# Altium footprint library MODULE_MISC.PcbLib: 28 footprints (part 2 of 2)
Each footprint in its own frame and in the unit in brackets; x right, y up, seen from the top. Pads: shape width x height; smd on the part's side, far side on the other; paste and mask are expansions set on the pad; w line width, h text height; cw(c..) or ccw(c..) is an arc to the next point about the centre after c.
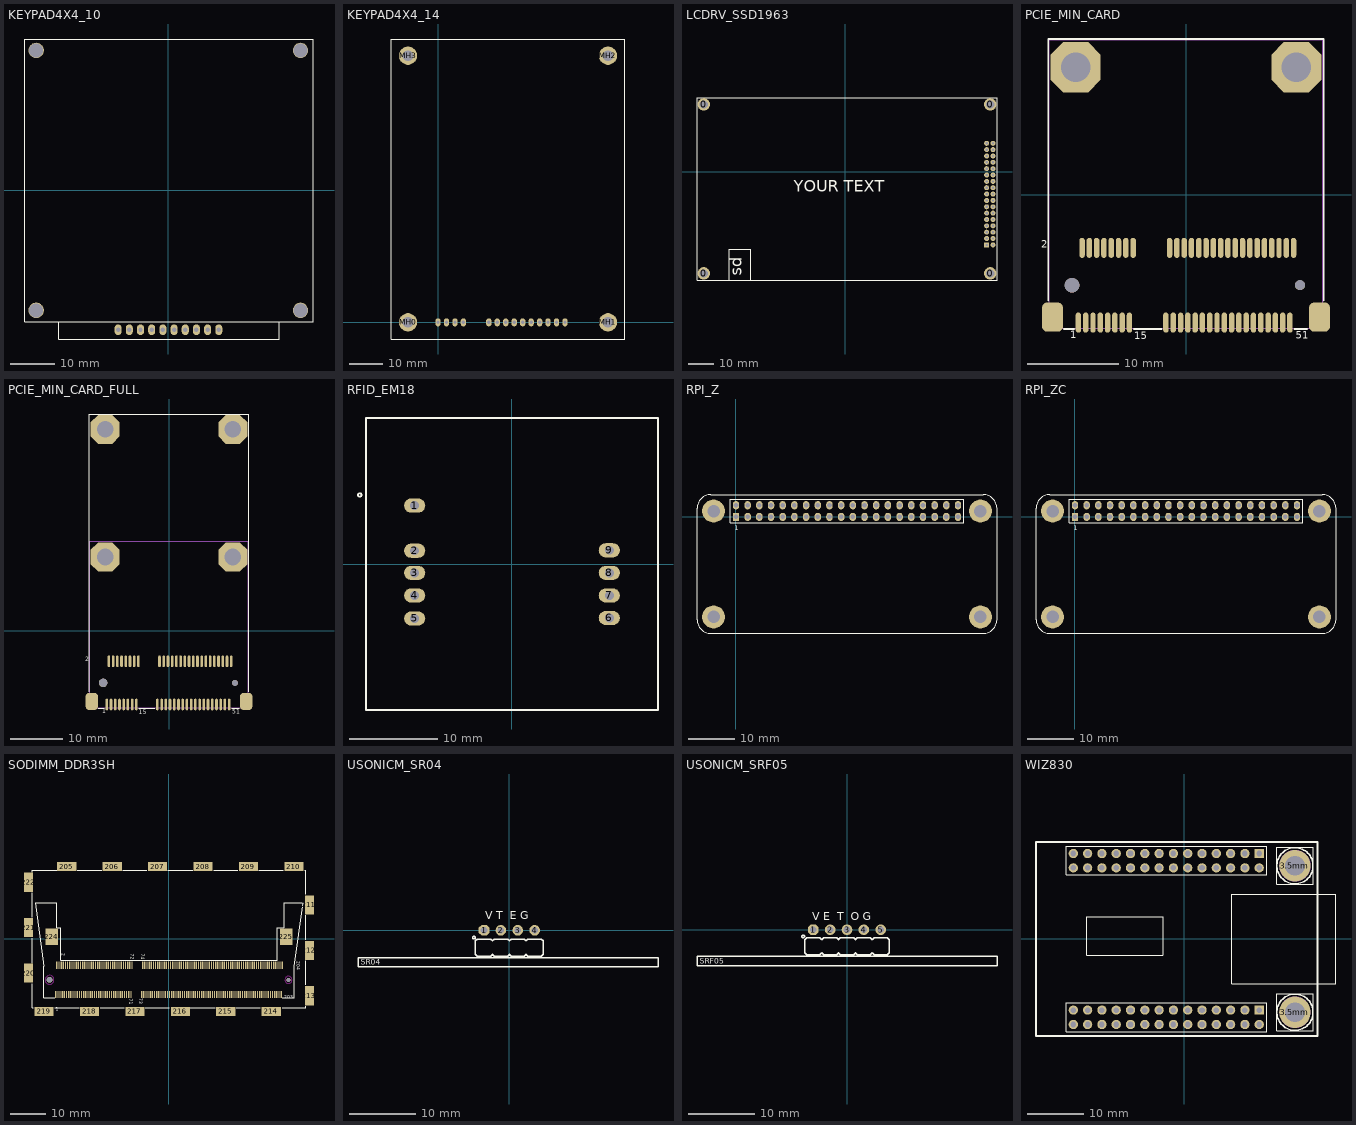
[diagram p1: the footprints below, top view; thin cyan lines are the x and y axes]

## KEYPAD4X4_10 [mm] "Matrix Keyboard 4x4"
pads (14):
  oval 1.6x2.4 hole 1: C1(-8.86,-31.7) C2(-6.32,-31.7) C3(-3.78,-31.7) C4(-1.24,-31.7) R1(1.3,-31.7) R2(3.84,-31.7) R3(6.38,-31.7) R4(8.92,-31.7) ""(-11.4,-31.7) ""(11.46,-31.7)
  round 3.5 / inner round 3.5 / far side round 5.5 hole 3.2: ""(-30,-27.3) ""(-30,31.7) ""(30,-27.3) ""(30,31.7)
Top Overlay:
  lines w0.2: -24.9,-29.9 -24.9,-33.8 25.2,-33.8 25.2,-29.9 ; -32.6,-29.9 -32.6,34.3 32.9,34.3 32.9,-29.9 -32.6,-29.9
3D body "User Library-Keypad 4x4.step": height 12.08, standoff 2.68, extent -32.539,-33.6 32.739,34.218

## KEYPAD4X4_14 [mm] "Matrix Keyboard 4x4"
pads (18):
  oval 1.6x2.4 hole 1: C1(17.78,0) C2(20.32,0) C3(22.86,0) C4(25.4,0) COM(38.1,0) L1(27.94,0) L2(30.48,0) L3(33.02,0) L4(35.56,0) R1(0,0) R2(2.54,0) R3(5.08,0) R4(7.62,0) V(15.24,0)
  round 5.5 hole 3.2: MH0(-9,0) MH1(51,0) MH2(51,80) MH3(-9,80)
Top Overlay:
  lines w0.2: -14,-5 -14,85 56,85 56,-5 -14,-5
3D body "header04-15mm.STEP": height 18.03, standoff -2.54, extent -1.27,-1.27 8.89,1.27
3D body "header10-15mm.STEP": height 18.03, standoff -2.54, extent 13.97,-1.27 39.37,1.27
3D body "Spacer.STEP": height 15, standoff -5, extent -11.858,77.525 -6.142,82.475
3D body "Spacer.STEP": height 15, standoff -5, extent -11.858,-2.475 -6.142,2.475
3D body "Spacer.STEP": height 15, standoff -5, extent 48.142,-2.475 53.858,2.475
3D body "Spacer.STEP": height 15, standoff -5, extent 48.142,77.525 53.858,82.475
3D body "Keyboard.STEP": height 22.22, standoff 15, extent -14,-5 56,85

## LCDRV_SSD1963 [mm] "SSD1963 Module.3 Or 5 Inch"
pads (38):
  round 5 hole 3.2: 0(-56.6,-40.7) 0(-56.6,26.9) 0(58,-40.7) 0(58,26.9)
  rect 2x2 hole 0.9: 1(56.56,-29.3)
  round 2 hole 0.9: 2(59.1,-29.3) 3(56.56,-26.76) 4(59.1,-26.76) 5(56.56,-24.22) 6(59.1,-24.22) 7(56.56,-21.68) 8(59.1,-21.68) 9(56.56,-19.14) 10(59.1,-19.14) 11(56.56,-16.6) 12(59.1,-16.6) 13(56.56,-14.06) 14(59.1,-14.06) 15(56.56,-11.52) 16(59.1,-11.52) 17(56.56,-8.98) 18(59.1,-8.98) 19(56.56,-6.44) 20(59.1,-6.44) 21(56.56,-3.9) 22(59.1,-3.9) 23(56.56,-1.36) 24(59.1,-1.36) 25(56.56,1.18) 26(59.1,1.18) 27(56.56,3.72) 28(59.1,3.72) 29(56.56,6.26) 30(59.1,6.26) 31(56.56,8.8) 32(59.1,8.8) 33(56.56,11.34) 34(59.1,11.34)
Top Overlay:
  lines w0.2: -38,-31 -37.9,-31 ; -37.9,-31 -37.9,-43.5 -46.4,-43.5 -46.4,-31 -37.9,-31
  lines w0.5: -59.3,-43.4 -59.3,29.6 60.7,29.6 60.7,-43.4 -59.3,-43.4
  text "YOUR TEXT" at -20.7,-9.6 h8
  text "sd" at -39.9,-41.7 h8
3D body "Header 6.STEP": height 9.54, standoff -2, extent 57.86,-30.59 60.35,-15.35
3D body "Header 10.STEP": height 9.54, standoff -2, extent 57.86,-15.35 60.35,10.05
3D body "Header 6.STEP": height 9.54, standoff -2, extent 55.32,-30.59 57.81,-15.35
3D body "Header 10.STEP": height 9.54, standoff -2, extent 55.32,-15.35 57.81,10.05
3D body "Header 2.STEP": height 9.54, standoff -2, extent 55.29,10.14 60.37,12.63
3D body "Header 6.STEP": height 9.54, standoff -2, extent -56.4,-30.69 -53.91,-15.45
3D body "Header 10.STEP": height 9.54, standoff -2, extent -56.4,-15.45 -53.91,9.95
3D body "Header 6.STEP": height 9.54, standoff -2, extent -58.94,-30.69 -56.45,-15.45
3D body "Header 10.STEP": height 9.54, standoff -2, extent -58.94,-15.45 -56.45,9.95
3D body "Header 2.STEP": height 9.54, standoff -2, extent -58.97,10.04 -53.89,12.53

## PCIE_MIN_CARD [mm] "PCIE_MINI_CARD molex 679100002"
height 4
pads (58):
  oval 0.6x2.2 smd: 1(-11.8,-14) 2(-11.4,-5.8) 3(-11,-14) 4(-10.6,-5.8) 5(-10.2,-14) 6(-9.8,-5.8) 7(-9.4,-14) 8(-9,-5.8) 9(-8.6,-14) 10(-8.2,-5.8) 11(-7.8,-14) 12(-7.4,-5.8) 13(-7,-14) 14(-6.6,-5.8) 15(-6.2,-14) 16(-5.8,-5.8) 17(-2.2,-14) 18(-1.8,-5.8) 19(-1.4,-14) 20(-1,-5.8) 21(-0.6,-14) 22(-0.2,-5.8) 23(0.2,-14) 24(0.6,-5.8) 25(1,-14) 26(1.4,-5.8) 27(1.8,-14) 28(2.2,-5.8) 29(2.6,-14) 30(3,-5.8) 31(3.4,-14) 32(3.8,-5.8) 33(4.2,-14) 34(4.6,-5.8) 35(5,-14) 36(5.4,-5.8) 37(5.8,-14) 38(6.2,-5.8) 39(6.6,-14) 40(7,-5.8) 41(7.4,-14) 42(7.8,-5.8) 43(8.2,-14) 44(8.6,-5.8) 45(9,-14) 46(9.4,-5.8) 47(9.8,-14) 48(10.2,-5.8) 49(10.6,-14) 50(11,-5.8) 51(11.4,-14) 52(11.8,-5.8)
  rrect50% 2.311x3.2 smd: " "(-14.65,-13.4) " "(14.65,-13.4)
  round 1.6 hole 1.6 unplated: " "(-12.5,-9.9)
  oct 5.5x5.5 hole 3.2: " "(-12.1,14) " "(12.1,14)
  round 1.1 hole 1.1 unplated: " "(12.5,-9.9)
Top Overlay:
  lines w0.2: -15.1,-11.6 -15.1,17.1 15.1,17.1 15.1,-11.6 ; -13.4,-14.7 -12.3,-14.7 ; -5.7,-14.7 -2.7,-14.7 ; 11.9,-14.7 13.3,-14.7
  text "1" at -12.7,-15.7 h0.8
  text "2" at -15.9,-5.8 h0.8
  text "51" at 12.011,-15.763 h0.8
  text "15" at -5.7,-15.8 h0.8
Top Solder:
  pour cut-out: 11.756,-15.054 11.756,-12.946 -2.556,-12.946 -2.556,-15.054
  pour cut-out: -5.844,-15.054 -5.844,-12.946 -12.156,-12.946 -12.156,-15.054
  pour cut-out: -5.444,-6.854 -5.444,-4.746 -11.756,-4.746 -11.756,-6.854
  pour cut-out: 12.156,-6.854 12.156,-4.746 -2.156,-4.746 -2.156,-6.854
Mechanical 13:
  lines w0.1: -15,-14.6 15,-14.6 15,17 -15,17 -15,-14.6
3D body "K3D-MM60-52B1-E1-R2 JAE Connector Division Proprietary.STEP": height 5.95, standoff -0.75, extent -14.85,-14.9 14.85,-4.9
3D body: height 4, standoff 0, extent -15,-14.6 15,17

## PCIE_MIN_CARD_FULL [mm] "PCIE_MINI_CARD molex 679100002"
height 4
pads (60):
  oval 0.5x2.2 smd mask+0.075: 1(-11.8,-14) 2(-11.4,-5.8) 3(-11,-14) 4(-10.6,-5.8) 5(-10.2,-14) 6(-9.8,-5.8) 7(-9.4,-14) 8(-9,-5.8) 9(-8.6,-14) 10(-8.2,-5.8) 11(-7.8,-14) 12(-7.4,-5.8) 13(-7,-14) 14(-6.6,-5.8) 15(-6.2,-14) 16(-5.8,-5.8) 17(-2.2,-14) 18(-1.8,-5.8) 19(-1.4,-14) 20(-1,-5.8) 21(-0.6,-14) 22(-0.2,-5.8) 23(0.2,-14) 24(0.6,-5.8) 25(1,-14) 26(1.4,-5.8) 27(1.8,-14) 28(2.2,-5.8) 29(2.6,-14) 30(3,-5.8) 31(3.4,-14) 32(3.8,-5.8) 33(4.2,-14) 34(4.6,-5.8) 35(5,-14) 36(5.4,-5.8) 37(5.8,-14) 38(6.2,-5.8) 39(6.6,-14) 40(7,-5.8) 41(7.4,-14) 42(7.8,-5.8) 43(8.2,-14) 44(8.6,-5.8) 45(9,-14) 46(9.4,-5.8) 47(9.8,-14) 48(10.2,-5.8) 49(10.6,-14) 50(11,-5.8) 51(11.4,-14) 52(11.8,-5.8)
  rrect50% 2.311x3.2 smd: " "(-14.65,-13.4) " "(14.65,-13.4)
  round 1.6 hole 1.6 unplated: " "(-12.5,-9.9)
  round 1.1 hole 1.1 unplated: " "(12.5,-9.9)
  oct 5.5x5.5 hole 3.2 unplated: ""(-12.1,14) ""(-12.1,38.2) ""(12.1,14) ""(12.1,38.2)
Top Overlay:
  lines w0.2: -15.1,-11.6 -15.1,41.1 15.1,41.1 15.1,-11.6 ; -13.4,-14.7 -12.3,-14.7 ; -5.7,-14.7 -2.7,-14.7 ; 11.9,-14.7 13.3,-14.7
  text "15" at -5.7,-15.8 h0.8
  text "51" at 12.011,-15.763 h0.8
  text "2" at -15.9,-5.8 h0.8
  text "1" at -12.7,-15.7 h0.8
Mechanical 13:
  lines w0.1: -15,-14.6 -15,17 15,17 15,-14.6 -15,-14.6
3D body "User Library-PCI Express Mini Card (Full-Mini Card).step": height 4.8, standoff 0.05, extent -15,-9.9 15,41.05
3D body "K3D-MM60-52B1-E1-R2 JAE Connector Division Proprietary.STEP": height 5.95, standoff -0.75, extent -14.85,-14.9 14.85,-4.9

## RFID_EM18 [mm] "MODULE, RFID Reader, EM-18"
pads (9):
  oval 2.4x1.6 hole 1: 1(-11,6.65) 2(-11,1.55) 3(-11,-0.95) 4(-11,-3.5) 5(-11,-6.1) 6(11,-6.05) 7(11,-3.5) 8(11,-0.95) 9(11,1.6)
Top Overlay:
  circle w0.2: c-17.2,7.849 r0.2
  lines w0.2: -16.5,-16.45 16.5,-16.45 16.5,16.45 16.5,16.55 -16.5,16.55 -16.5,-16.45
3D body "User Library-EM-18.STEP": height 8.05, standoff -6.1, extent -16.5,-16.45 16.5,16.55

## RPI_Z [mm] "Raspberry Pi Zero 65X30mm"
pads (44):
  rect 1.4x1.8 hole 1: 1(0,0)
  oval 1.4x1.8 hole 1: 2(0,2.54) 3(2.54,0) 4(2.54,2.54) 5(5.08,0) 6(5.08,2.54) 7(7.62,0) 8(7.62,2.54) 9(10.16,0) 10(10.16,2.54) 11(12.7,0) 12(12.7,2.54) 13(15.24,0) 14(15.24,2.54) 15(17.78,0) 16(17.78,2.54) 17(20.32,0) 18(20.32,2.54) 19(22.86,0) 20(22.86,2.54) 21(25.4,0) 22(25.4,2.54) 23(27.94,0) 24(27.94,2.54) 25(30.48,0) 26(30.48,2.54) 27(33.02,0) 28(33.02,2.54) 29(35.56,0) 30(35.56,2.54) 31(38.1,0) 32(38.1,2.54) 33(40.64,0) 34(40.64,2.54) 35(43.18,0) 36(43.18,2.54) 37(45.72,0) 38(45.72,2.54) 39(48.26,0) 40(48.26,2.54)
  round 5 / inner round 3 / far side round 5 hole 2.7 mask+0.1: ""(-4.87,-21.73) ""(-4.87,1.27) ""(53.13,-21.73) ""(53.13,1.27)
Top Overlay:
  lines w0.2: -8.47,-22.33 ccw(c-5.47,-22.33) -5.47,-25.33 53.73,-25.33 ccw(c53.73,-22.33) 56.73,-22.33 56.73,1.87 ccw(c53.73,1.87) 53.73,4.87 -5.47,4.87 ccw(c-5.47,1.87) -8.47,1.87 -8.47,-22.33 ; -1.27,-1.27 -1.27,3.81 49.53,3.81 49.53,-1.27 -1.27,-1.27
  text "1" at -0.318,-2.857 h1
3D body "PLD-40.step": height -3.1, standoff -14.5, extent -1.27,-1.23 49.53,3.77
3D body "RaspberryPiZero.STEP": height 15.55, standoff 11.1, extent -8.37,-26.43 56.63,4.8
3D body "PBD-2.stp": height 8.5, standoff -3.15, extent 46.99,-1.27 49.53,3.81
3D body "PBD-2.stp": height 8.5, standoff -3.15, extent 44.45,-1.27 46.99,3.81
3D body "PBD-2.stp": height 8.5, standoff -3.15, extent 39.37,-1.27 41.91,3.81
3D body "PBD-2.stp": height 8.5, standoff -3.15, extent 36.83,-1.27 39.37,3.81
3D body "PBD-2.stp": height 8.5, standoff -3.15, extent 41.91,-1.27 44.45,3.81
3D body "PBD-2.stp": height 8.5, standoff -3.15, extent 31.75,-1.27 34.29,3.81
3D body "PBD-2.stp": height 8.5, standoff -3.15, extent 29.21,-1.27 31.75,3.81
3D body "PBD-2.stp": height 8.5, standoff -3.15, extent 34.29,-1.27 36.83,3.81
3D body "PBD-2.stp": height 8.5, standoff -3.15, extent 24.13,-1.27 26.67,3.81
3D body "PBD-2.stp": height 8.5, standoff -3.15, extent 21.59,-1.27 24.13,3.81
3D body "PBD-2.stp": height 8.5, standoff -3.15, extent 26.67,-1.27 29.21,3.81
3D body "PBD-2.stp": height 8.5, standoff -3.15, extent 16.51,-1.27 19.05,3.81
3D body "PBD-2.stp": height 8.5, standoff -3.15, extent 13.97,-1.27 16.51,3.81
3D body "PBD-2.stp": height 8.5, standoff -3.15, extent 19.05,-1.27 21.59,3.81
3D body "PBD-2.stp": height 8.5, standoff -3.15, extent 8.89,-1.27 11.43,3.81
3D body "PBD-2.stp": height 8.5, standoff -3.15, extent 6.35,-1.27 8.89,3.81
3D body "PBD-2.stp": height 8.5, standoff -3.15, extent 11.43,-1.27 13.97,3.81
3D body "PBD-2.stp": height 8.5, standoff -3.15, extent 1.27,-1.27 3.81,3.81
3D body "PBD-2.stp": height 8.5, standoff -3.15, extent -1.27,-1.27 1.27,3.81
3D body "PBD-2.stp": height 8.5, standoff -3.15, extent 3.81,-1.27 6.35,3.81

## RPI_ZC [mm] "Raspberry Pi Zero 65X30mm with Cam connector"
pads (44):
  rect 1.4x1.8 hole 1: 1(0,0)
  oval 1.4x1.8 hole 1: 2(0,2.54) 3(2.54,0) 4(2.54,2.54) 5(5.08,0) 6(5.08,2.54) 7(7.62,0) 8(7.62,2.54) 9(10.16,0) 10(10.16,2.54) 11(12.7,0) 12(12.7,2.54) 13(15.24,0) 14(15.24,2.54) 15(17.78,0) 16(17.78,2.54) 17(20.32,0) 18(20.32,2.54) 19(22.86,0) 20(22.86,2.54) 21(25.4,0) 22(25.4,2.54) 23(27.94,0) 24(27.94,2.54) 25(30.48,0) 26(30.48,2.54) 27(33.02,0) 28(33.02,2.54) 29(35.56,0) 30(35.56,2.54) 31(38.1,0) 32(38.1,2.54) 33(40.64,0) 34(40.64,2.54) 35(43.18,0) 36(43.18,2.54) 37(45.72,0) 38(45.72,2.54) 39(48.26,0) 40(48.26,2.54)
  round 5 / inner round 3 / far side round 5 hole 2.7 mask+0.1: ""(-4.87,-21.73) ""(-4.87,1.27) ""(53.13,-21.73) ""(53.13,1.27)
Top Overlay:
  lines w0.2: -8.47,-22.33 ccw(c-5.47,-22.33) -5.47,-25.33 53.73,-25.33 ccw(c53.73,-22.33) 56.73,-22.33 56.73,1.87 ccw(c53.73,1.87) 53.73,4.87 -5.47,4.87 ccw(c-5.47,1.87) -8.47,1.87 -8.47,-22.33 ; -1.27,-1.27 -1.27,3.81 49.53,3.81 49.53,-1.27 -1.27,-1.27
  text "1" at -0.318,-2.857 h1
3D body "PLD-40.step": height -3.1, standoff -14.5, extent -1.27,-1.23 49.53,3.77
3D body "RaspberryPiZeroW.STEP": height 16.3, standoff 11.5, extent -8.32,-26.43 57.58,4.82
3D body "PBD-2.stp": height 8.5, standoff -3.15, extent 46.99,-1.27 49.53,3.81
3D body "PBD-2.stp": height 8.5, standoff -3.15, extent 44.45,-1.27 46.99,3.81
3D body "PBD-2.stp": height 8.5, standoff -3.15, extent 39.37,-1.27 41.91,3.81
3D body "PBD-2.stp": height 8.5, standoff -3.15, extent 36.83,-1.27 39.37,3.81
3D body "PBD-2.stp": height 8.5, standoff -3.15, extent 41.91,-1.27 44.45,3.81
3D body "PBD-2.stp": height 8.5, standoff -3.15, extent 31.75,-1.27 34.29,3.81
3D body "PBD-2.stp": height 8.5, standoff -3.15, extent 29.21,-1.27 31.75,3.81
3D body "PBD-2.stp": height 8.5, standoff -3.15, extent 34.29,-1.27 36.83,3.81
3D body "PBD-2.stp": height 8.5, standoff -3.15, extent 24.13,-1.27 26.67,3.81
3D body "PBD-2.stp": height 8.5, standoff -3.15, extent 21.59,-1.27 24.13,3.81
3D body "PBD-2.stp": height 8.5, standoff -3.15, extent 26.67,-1.27 29.21,3.81
3D body "PBD-2.stp": height 8.5, standoff -3.15, extent 16.51,-1.27 19.05,3.81
3D body "PBD-2.stp": height 8.5, standoff -3.15, extent 13.97,-1.27 16.51,3.81
3D body "PBD-2.stp": height 8.5, standoff -3.15, extent 19.05,-1.27 21.59,3.81
3D body "PBD-2.stp": height 8.5, standoff -3.15, extent 8.89,-1.27 11.43,3.81
3D body "PBD-2.stp": height 8.5, standoff -3.15, extent 6.35,-1.27 8.89,3.81
3D body "PBD-2.stp": height 8.5, standoff -3.15, extent 11.43,-1.27 13.97,3.81
3D body "PBD-2.stp": height 8.5, standoff -3.15, extent 1.27,-1.27 3.81,3.81
3D body "PBD-2.stp": height 8.5, standoff -3.15, extent -1.27,-1.27 1.27,3.81
3D body "PBD-2.stp": height 8.5, standoff -3.15, extent 3.81,-1.27 6.35,3.81

## SODIMM_DDR3SH [mil] "DDR3_SO-DIMM_SHIELDED"
pads (226):
  rect 14x79 smd: 1(-1243.62,-612.67) 2(-1231.81,-289.83) 3(-1220,-612.67) 4(-1208.19,-289.83) 5(-1196.38,-612.67) 6(-1184.57,-289.83) 7(-1172.76,-612.67) 8(-1160.94,-289.83) 9(-1149.13,-612.67) 10(-1137.32,-289.83) 11(-1125.51,-612.67) 12(-1113.7,-289.83) 13(-1101.89,-612.67) 14(-1090.08,-289.83) 15(-1078.27,-612.67) 16(-1066.46,-289.83) 17(-1054.65,-612.67) 18(-1042.83,-289.83) 19(-1031.02,-612.67) 20(-1019.21,-289.83) 21(-1007.4,-612.67) 22(-995.59,-289.83) 23(-983.78,-612.67) 24(-971.97,-289.83) 25(-960.16,-612.67) 26(-948.35,-289.83) 27(-936.54,-612.67) 28(-924.72,-289.83) 29(-912.91,-612.67) 30(-901.1,-289.83) 31(-889.29,-612.67) 32(-877.48,-289.83) 33(-865.67,-612.67) 34(-853.86,-289.83) 35(-842.05,-612.67) 36(-830.24,-289.83) 37(-818.43,-612.67) 38(-806.61,-289.83) 39(-794.8,-612.67) 40(-782.99,-289.83) 41(-771.18,-612.67) 42(-759.37,-289.83) 43(-747.56,-612.67) 44(-735.75,-289.83) 45(-723.94,-612.67) 46(-712.13,-289.83) 47(-700.32,-612.67) 48(-688.5,-289.83) 49(-676.69,-612.67) 50(-664.88,-289.83) 51(-653.07,-612.67) 52(-641.26,-289.83) 53(-629.45,-612.67) 54(-617.64,-289.83) 55(-605.83,-612.67) 56(-594.02,-289.83) 57(-582.2,-612.67) 58(-570.39,-289.83) 59(-558.58,-612.67) 60(-546.77,-289.83) 61(-534.96,-612.67) 62(-523.15,-289.83) 63(-511.34,-612.67) 64(-499.53,-289.83) 65(-487.72,-612.67) 66(-475.91,-289.83) 67(-464.09,-612.67) 68(-452.28,-289.83) 69(-440.47,-612.67) 70(-428.66,-289.83) 71(-416.85,-612.67) 72(-405.04,-289.83) 73(-298.74,-612.67) 74(-286.93,-289.83) 75(-275.12,-612.67) 76(-263.31,-289.83) 77(-251.5,-612.67) 78(-239.69,-289.83) 79(-227.87,-612.67) 80(-216.06,-289.83) 81(-204.25,-612.67) 82(-192.44,-289.83) 83(-180.63,-612.67) 84(-168.82,-289.83) 85(-157.01,-612.67) 86(-145.2,-289.83) 87(-133.39,-612.67) 88(-121.57,-289.83) 89(-109.76,-612.67) 90(-97.95,-289.83) 91(-86.14,-612.67) 92(-74.33,-289.83) 93(-62.52,-612.67) 94(-50.71,-289.83) 95(-38.9,-612.67) 96(-27.09,-289.83) 97(-15.28,-612.67) 98(-3.46,-289.83) 99(8.35,-612.67) 100(20.16,-289.83) 101(31.97,-612.67) 102(43.78,-289.83) 103(55.59,-612.67) 104(67.4,-289.83) 105(79.21,-612.67) 106(91.02,-289.83) 107(102.83,-612.67) 108(114.65,-289.83) 109(126.46,-612.67) 110(138.27,-289.83) 111(150.08,-612.67) 112(161.89,-289.83) 113(173.7,-612.67) 114(185.51,-289.83) 115(197.32,-612.67) 116(209.13,-289.83) 117(220.94,-612.67) 118(232.76,-289.83) 119(244.57,-612.67) 120(256.38,-289.83) 121(268.19,-612.67) 122(280,-289.83) 123(291.81,-612.67) 124(303.62,-289.83) 125(315.43,-612.67) 126(327.24,-289.83) 127(339.06,-612.67) 128(350.87,-289.83) 129(362.68,-612.67) 130(374.49,-289.83) 131(386.3,-612.67) 132(398.11,-289.83) 133(409.92,-612.67) 134(421.73,-289.83) 135(433.54,-612.67) 136(445.35,-289.83) 137(457.17,-612.67) 138(468.98,-289.83) 139(480.79,-612.67) 140(492.6,-289.83) 141(504.41,-612.67) 142(516.22,-289.83) 143(528.03,-612.67) 144(539.84,-289.83) 145(551.65,-612.67) 146(563.46,-289.83) 147(575.28,-612.67) 148(587.09,-289.83) 149(598.9,-612.67) 150(610.71,-289.83) 151(622.52,-612.67) 152(634.33,-289.83) 153(646.14,-612.67) 154(657.95,-289.83) 155(669.76,-612.67) 156(681.57,-289.83) 157(693.39,-612.67) 158(705.2,-289.83) 159(717.01,-612.67) 160(728.82,-289.83) 161(740.63,-612.67) 162(752.44,-289.83) 163(764.25,-612.67) 164(776.06,-289.83) 165(787.87,-612.67) 166(799.68,-289.83) 167(811.5,-612.67) 168(823.31,-289.83) 169(835.12,-612.67) 170(846.93,-289.83) 171(858.74,-612.67) 172(870.55,-289.83) 173(882.36,-612.67) 174(894.17,-289.83) 175(905.98,-612.67) 176(917.8,-289.83) 177(929.61,-612.67) 178(941.42,-289.83) 179(953.23,-612.67) 180(965.04,-289.83) 181(976.85,-612.67) 182(988.66,-289.83) 183(1000.47,-612.67) 184(1012.28,-289.83) 185(1024.09,-612.67) 186(1035.91,-289.83) 187(1047.72,-612.67) 188(1059.53,-289.83) 189(1071.34,-612.67) 190(1083.15,-289.83) 191(1094.96,-612.67) 192(1106.77,-289.83) 193(1118.58,-612.67) 194(1130.39,-289.83) 195(1142.2,-612.67) 196(1154.02,-289.83) 197(1165.83,-612.67) 198(1177.64,-289.83) 199(1189.45,-612.67) 200(1201.26,-289.83) 201(1213.07,-612.67) 202(1224.88,-289.83) 203(1236.69,-612.67) 204(1248.5,-289.83)
  rect 210x100 smd: 205(-1122.56,794.55) 206(-622.56,794.55) 207(-122.56,794.55) 208(377.44,794.55) 209(877.44,794.55) 210(1377.44,794.55) 214(1127.44,-797.45) 215(627.44,-797.45) 216(127.44,-797.45) 217(-372.56,-797.45) 218(-872.56,-797.45) 219(-1372.56,-797.45)
  rect 100x210 smd: 211(1548.44,373.55) 212(1548.44,-126.45) 213(1548.44,-626.45) 220(-1543.56,-376.45) 221(-1543.56,123.55) 222(-1543.56,623.55)
  rect 138x181 smd: 224(-1288.9,21.19) 225(1293.78,21.19)
  round 63 hole 63: " "(-1312.52,-451.25)
  round 43 hole 43: " "(1317.4,-451.25)
Top Overlay:
  lines w6: -1503.56,-491.25 -1503.56,-757.45 -1489.75,-757.45 ; -1503.56,-267.25 -1503.56,4.75 ; -1503.56,236.75 -1503.56,508.75 ; -1503.56,732.75 -1503.56,754.55 -1233.75,754.55 ; -1257.81,-648.1 -1377.48,-648.1 -1377.48,-301.65 -1471.97,395.2 -1235.75,395.2 -1235.75,124.91 -1187.98,124.91 -1187.98,-237.96 1192.7,-237.96 1192.7,123.94 1264.68,123.94 1264.32,395.2 1480.79,395.2 1382.36,-301.65 1382.36,-648.1 1250.5,-648.1 ; -1257.75,-757.45 -985.75,-757.45 ; -1009.75,754.55 -737.75,754.55 ; -753.75,-757.45 -489.75,-757.45 ; -505.75,754.55 -241.75,754.55 ; -257.75,-757.45 6.25,-757.45 ; -9.75,754.55 262.25,754.55 ; 238.25,-757.45 510.25,-757.45 ; 494.25,754.55 758.25,754.55 ; 742.25,-757.45 1006.25,-757.45 ; 990.25,754.55 1262.25,754.55 ; 1246.25,-757.45 1508.44,-757.45 1508.44,-739.25 ; 1494.25,754.55 1508.44,754.55 1508.44,492.75 ; 1508.44,-507.25 1508.44,-243.25 ; 1508.44,-11.25 1508.44,260.75
  text "203" at 1269.39,-658.74 h35
  text "73" at -325.61,-656.07 h35
  text "71" at -435.61,-661.07 h35
  text "1" at -1245.61,-790.07 h35
  text "204" at 1407.72,-247.07 h35
  text "74" at -305.61,-166.07 h35
  text "72" at -420.61,-166.07 h35
  text "2" at -1175.61,-160.07 h35
Multi-Layer keep-out:
  circle w1: c1317.4,-451.25 r39
  circle w1: c1317.4,-451.25 r39
  circle w1: c-1312.52,-451.25 r49
  circle w1: c-1312.52,-451.25 r49

## USONICM_SR04 [mm] "Ultrasonic sensor Module, HC-SR04"
pads (4):
  oct 1.6x1.6 / inner oct 1.6x1.6 / far side oct 1.6x2.2 hole 1 mask+0.1: 1(-3.81,0)
  round 1.6 / inner round 1.6 / far side oval 1.6x2.2 hole 1 mask+0.1: 2(-1.27,0) 3(1.27,0) 4(3.81,0)
Top Overlay:
  circle w0.2: c-5.33,-1.1 r0.2
  lines w0.2: -2.57,-3.6 -2.27,-3.9 -0.27,-3.9 0.03,-3.6 ; -2.57,-1.6 -2.27,-1.3 -0.27,-1.3 0.03,-1.6 ; -2.51,-3.6 -2.81,-3.9 -4.81,-3.9 -5.11,-3.6 -5.11,-1.6 -4.81,-1.3 -2.81,-1.3 -2.51,-1.6 ; -0.03,-3.6 0.27,-3.9 2.27,-3.9 2.57,-3.6 ; -0.03,-1.6 0.27,-1.3 2.27,-1.3 2.57,-1.6 ; 2.51,-3.6 2.81,-3.9 4.81,-3.9 ; 2.51,-1.6 2.81,-1.3 4.81,-1.3 ; 4.81,-3.9 5.11,-3.6 ; 4.81,-3.9 5.11,-3.6 ; 4.81,-1.3 5.11,-1.6 ; 4.81,-1.3 5.11,-1.6 ; 5.11,-3.6 5.11,-1.6 ; -22.8,-5.5 -22.8,-4.1 22.4,-4.1 22.4,-5.5 -22.8,-5.5
  text "SR04" at -22.4,-5.2 h0.8
  text "V T  E G" at -3.63,1.7 h1.2
3D body "HC-SR04_User Library.STEP": height 20.6, standoff -4.58, extent -22.7,-17.8 22.3,0.268

## USONICM_SRF05 [mm] "Ultrasonic sensor Module, SRF05"
pads (5):
  oct 1.6x1.6 / inner oct 1.6x1.6 / far side oct 1.6x2.2 hole 1 mask+0.1: 1(-5.08,0)
  round 1.6 / inner round 1.6 / far side oval 1.6x2.2 hole 1 mask+0.1: 2(-2.54,0) 3(0,0) 4(2.54,0) 5(5.08,0)
Top Overlay:
  circle w0.2: c-6.6,-1 r0.2
  lines w0.2: -3.84,-3.5 -3.54,-3.8 -1.54,-3.8 -1.24,-3.5 ; -3.84,-1.5 -3.54,-1.2 -1.54,-1.2 -1.24,-1.5 ; -3.78,-3.5 -4.08,-3.8 -6.08,-3.8 -6.38,-3.5 -6.38,-1.5 -6.08,-1.2 -4.08,-1.2 -3.78,-1.5 ; -1.3,-3.5 -1,-3.8 1,-3.8 1.3,-3.5 ; -1.3,-1.5 -1,-1.2 1,-1.2 1.3,-1.5 ; 1.24,-3.5 1.54,-3.8 3.54,-3.8 3.84,-3.5 ; 1.24,-1.5 1.54,-1.2 3.54,-1.2 3.84,-1.5 ; 3.78,-3.5 4.08,-3.8 6.08,-3.8 6.38,-3.5 6.38,-1.5 6.08,-1.2 4.08,-1.2 3.78,-1.5 ; -22.6,-5.4 -22.6,-4 22.6,-4 22.6,-5.4 -22.6,-5.4
  text "V E  T  O G" at -5.2,1.4 h1.2
  text "SRF05" at -22.2,-5.1 h0.8
3D body "HY-SRF05_v3.stp": height 20.3, standoff -6.3, extent -22.5,-17.7 22.5,0.327

## WIZ830 [mil]
pads (58):
  round 220.47 hole 137.8: 3.5mm(775,-512.3) 3.5mm(775,512.1)
  rect 65x65 hole 39.37: J1-1(525,597.7) J2-1(525,-497.3)
  round 65 hole 39.37: J1-2(525,497.3) J1-3(425,597.7) J1-4(425,497.3) J1-5(325,597.7) J1-6(325,497.3) J1-7(225,597.7) J1-8(225,497.3) J1-9(125,597.7) J1-10(125,497.3) J1-11(25,597.7) J1-12(25,497.3) J1-13(-75,597.7) J1-14(-75,497.3) J1-15(-175,597.7) J1-16(-175,497.3) J1-17(-275,597.7) J1-18(-275,497.3) J1-19(-375,597.7) J1-20(-375,497.3) J1-21(-475,597.7) J1-22(-475,497.3) J1-23(-575,597.7) J1-24(-575,497.3) J1-25(-675,597.7) J1-26(-675,497.3) J1-27(-775,597.7) J1-28(-775,497.3) J2-2(525,-597.7) J2-3(425,-497.3) J2-4(425,-597.7) J2-5(325,-497.3) J2-6(325,-597.7) J2-7(225,-497.3) J2-8(225,-597.7) J2-9(125,-497.3) J2-10(125,-597.7) J2-11(25,-497.3) J2-12(25,-597.7) J2-13(-75,-497.3) J2-14(-75,-597.7) J2-15(-175,-497.3) J2-16(-175,-597.7) J2-17(-275,-497.3) J2-18(-275,-597.7) J2-19(-375,-497.3) J2-20(-375,-597.7) J2-21(-475,-497.3) J2-22(-475,-597.7) J2-23(-575,-497.3) J2-24(-575,-597.7) J2-25(-675,-497.3) J2-26(-675,-597.7) J2-27(-775,-497.3) J2-28(-775,-597.7)
Top Overlay:
  circle w10: c775,-512.3 r125.98
  circle w5: c774.52,-512.27 r59.06
  circle w5: c774.52,511.35 r59.06
  circle w10: c775,512.1 r125.98
  lines w5: -682.17,-113.57 -682.17,157.02 -150.68,157.02 -150.68,-113.57 -682.17,-113.57 ; 333.57,-313.45 1061.92,-313.45 1061.92,312.54 333.57,312.54 333.57,-313.45
  lines w7.87: -823.4,-647.3 576.6,-647.3 576.6,-447.3 -823.4,-447.3 -823.4,-647.3 ; -823.4,447.7 -823.4,647.7 576.6,647.7 576.6,447.7 -823.4,447.7 ; 647,-640.3 647,-384.3 903,-384.3 903,-640.3 647,-640.3 ; 647,384.1 903,384.1 903,640.1 647,640.1 647,384.1
  lines w11.81: -1036,-679.04 -1036,678.84 932,678.84 932,-679.04 -1036,-679.04
Keep-Out Layer:
  circle w39.37: c775,512.1 r78.74
Mechanical 7:
  circle w3.94: c775,512.18 r106.3
  circle w47.24: c775,512.1 r86.61
  circle w3.94: c775,-512.38 r106.3
  region: 755.28,575.09 711.97,575.09 711.97,543.59 755.28,543.59
  region: 743.49,531.76 743.49,575.07 712,575.07 712,531.76
  region: 733.03,565.85 721.22,554.04 743.49,531.76 755.3,543.58
  region: 837.98,531.76 837.98,575.07 806.48,575.07 806.48,531.76
  rectangle: 794.67,543.57 837.98,575.06
  region: 828.73,554.05 816.92,565.86 794.65,543.59 806.46,531.78
  rectangle: 794.67,449.09 837.98,480.58
  region: 816.9,458.3 828.71,470.11 806.44,492.38 794.63,480.57
  region: 712,492.39 712,449.09 743.49,449.09 743.49,492.39
  region: 755.3,480.58 712,480.58 712,449.09 755.3,449.09
  region: 721.22,470.14 733.03,458.33 755.3,480.6 743.49,492.41
  region: 743.47,-492.63 755.29,-480.82 733.01,-458.55 721.2,-470.36
  region: 755.31,-449.31 712,-449.31 712,-480.81 755.31,-480.81
  region: 743.49,-492.61 743.49,-449.31 712,-449.31 712,-492.61
  region: 794.65,-480.8 806.46,-492.61 828.73,-470.34 816.92,-458.53
  rectangle: 794.67,-480.82 837.98,-449.32
  region: 806.48,-531.99 794.67,-543.8 816.94,-566.07 828.75,-554.26
  rectangle: 794.67,-575.29 837.98,-543.8
  region: 806.48,-531.99 806.48,-575.3 837.98,-575.3 837.98,-531.99
  region: 755.31,-543.8 743.5,-531.99 721.23,-554.26 733.04,-566.07
  region: 712,-531.98 712,-575.29 743.49,-575.29 743.49,-531.98
  region: 755.3,-543.79 712,-543.79 712,-575.29 755.3,-575.29